# Altium footprint library camara_Trap.PcbLib: 29 footprints (part 1 of 2)
Each footprint in its own frame and in the unit in brackets; x right, y up, seen from the top. Pads: shape width x height; smd on the part's side, far side on the other; paste and mask are expansions set on the pad; w line width, h text height; cw(c..) or ccw(c..) is an arc to the next point about the centre after c.
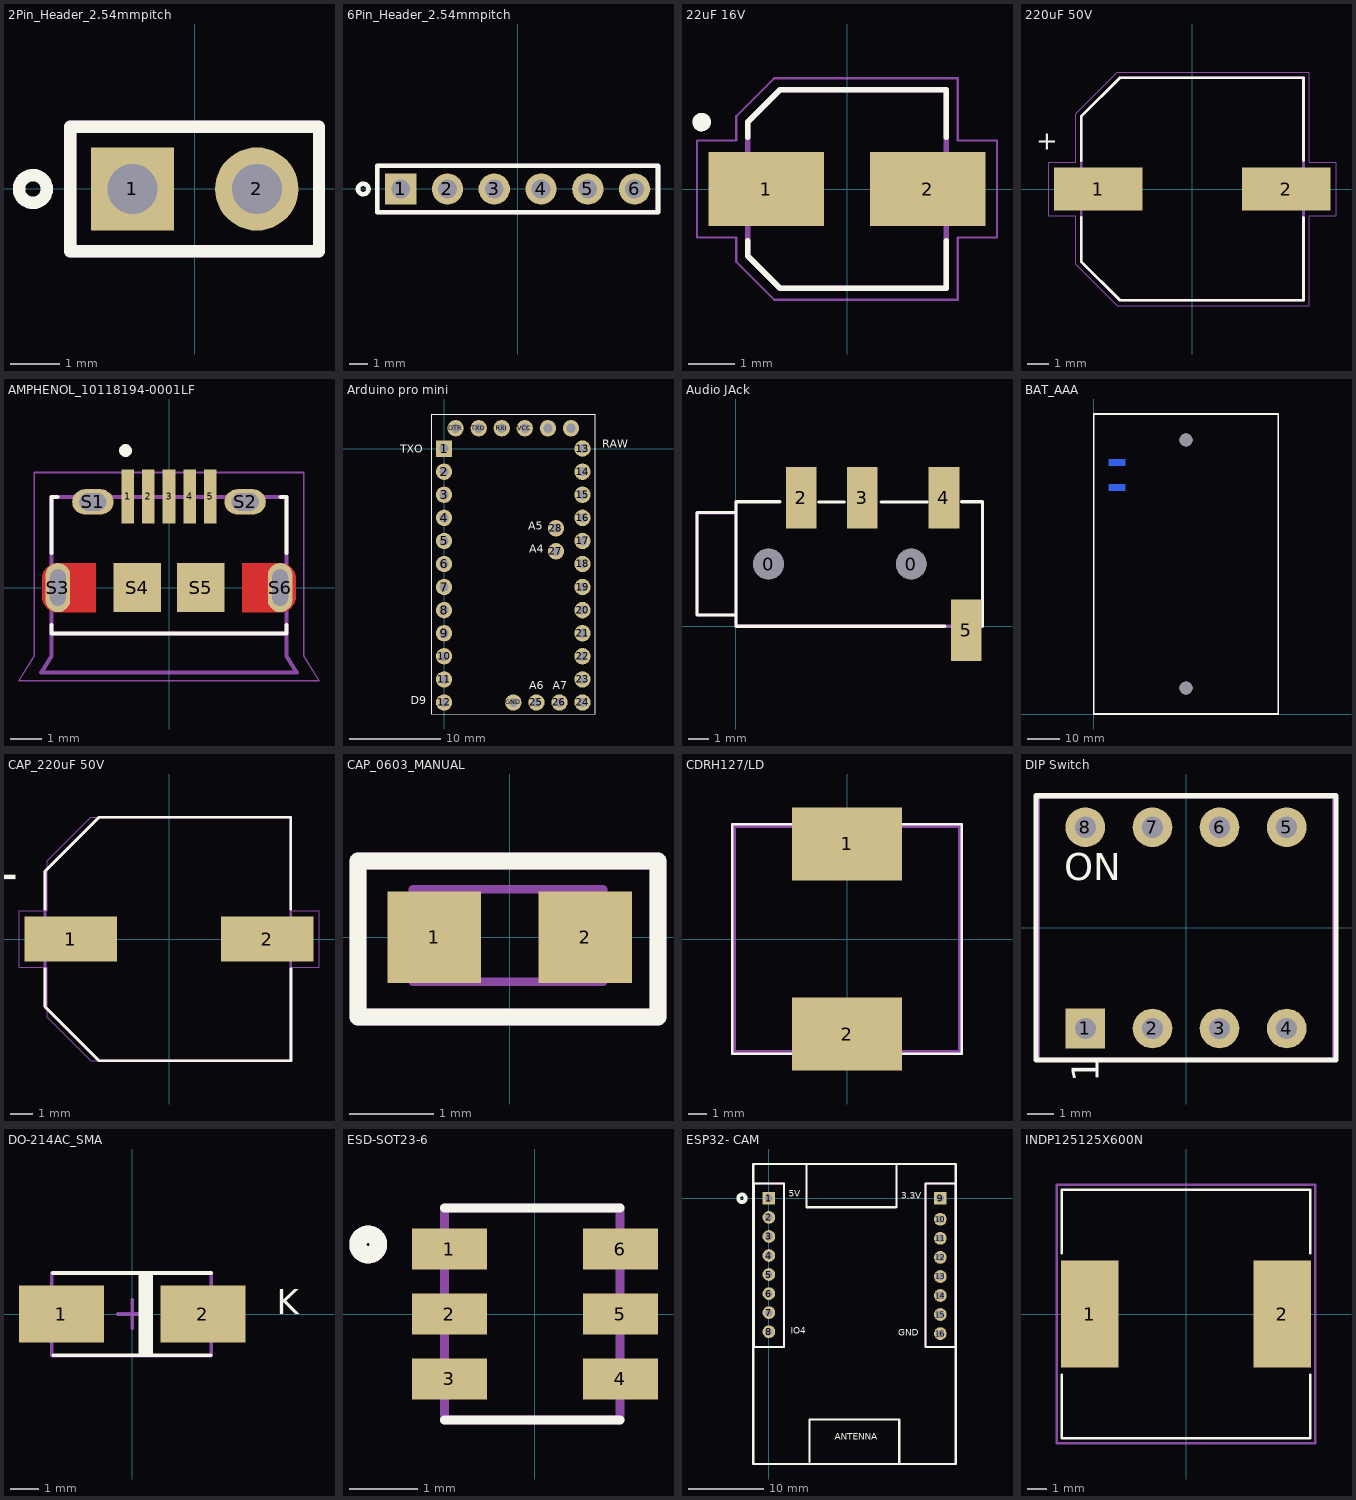
[diagram p0: the footprints below, top view; thin cyan lines are the x and y axes]

## 2Pin_Header_2.54mmpitch [mm]
pads (2):
  rect 1.7x1.7 hole 1.02: 1(-1.27,0)
  round 1.7 hole 1.02: 2(1.27,0)
Top Overlay:
  circle w0.254: c-3.302,0 r0.284
  lines w0.254: -2.54,-1.27 2.54,-1.27 2.54,1.27 -2.54,1.27 -2.54,-1.27
Mechanical 13:
  lines w0.254: -2.54,-1.27 2.54,-1.27 2.54,1.27 -2.54,1.27 -2.54,-1.27
Mechanical 15:
  lines w0.254: -2.54,-1.27 2.54,-1.27 2.54,1.27 -2.54,1.27 -2.54,-1.27
3D body "TSW-101-14-L-D.stp": height 10.17, standoff -3.29, extent -2.54,-1.27 2.54,1.27

## 6Pin_Header_2.54mmpitch [mm]
pads (6):
  rect 1.7x1.7 hole 1.02: 1(-6.35,0)
  round 1.7 hole 1.02: 2(-3.81,0) 3(-1.27,0) 4(1.27,0) 5(3.81,0) 6(6.35,0)
Top Overlay:
  circle w0.254: c-8.382,0 r0.284
  lines w0.254: -7.62,-1.27 7.62,-1.27 7.62,1.27 -7.62,1.27 -7.62,-1.27
Mechanical 13:
  lines w0.254: -7.62,-1.27 7.62,-1.27 7.62,1.27 -7.62,1.27 -7.62,-1.27
Mechanical 15:
  lines w0.254: -7.62,-1.27 7.62,-1.27 7.62,1.27 -7.62,1.27 -7.62,-1.27

## 22uF 16V [mm]
height 5.4
pads (2):
  rect 2.5x1.6 smd: 1(-1.75,0) 2(1.75,0)
Top Overlay:
  circle w0.2: c-3.15,1.45 r0.1
  lines w0.127: -2.15,-1.12 -2.15,-1.45 -1.45,-2.15 2.15,-2.15 2.15,-1.12 ; -2.15,1.12 -2.15,1.45 -1.45,2.15 2.15,2.15 2.15,1.12
Mechanical 13:
  circle w0.2: c-3.15,1.45 r0.1
  lines w0.127: -2.15,-1.45 -2.15,1.45 -1.45,2.15 2.15,2.15 2.15,-2.15 -1.45,-2.15 -2.15,-1.45
Mechanical 15:
  lines w0.05: -3.25,-1.05 -2.4,-1.05 -2.4,-1.575 -1.575,-2.4 2.4,-2.4 2.4,-1.05 3.25,-1.05 3.25,1.05 2.4,1.05 2.4,2.4 -1.575,2.4 -2.4,1.575 -2.4,1.05 -3.25,1.05 -3.25,-1.05
3D body "step_temp.STEP": height 5.4, standoff 0, extent -2.5,-2.15 2.5,2.15

## 220uF 50V [mm]
pads (2):
  rect 4.1x2 smd: 1(-4.35,0) 2(4.35,0)
Top Overlay:
  lines w0.127: -5.15,-1.32 -5.15,-3.35 -3.35,-5.15 5.15,-5.15 5.15,-1.32 ; -5.15,1.32 -5.15,3.35 -3.35,5.15 5.15,5.15 5.15,1.32
  text "+" at -7.239,1.524 h1.5
Mechanical 13:
  lines w0.127: -5.15,-3.35 -3.35,-5.15 5.15,-5.15 5.15,5.15 -3.35,5.15 -5.15,3.35 -5.15,-3.35
Mechanical 15:
  lines w0.05: -6.65,-1.25 -6.65,1.25 -5.4,1.25 -5.4,3.475 -3.475,5.4 5.4,5.4 5.4,1.25 6.65,1.25 6.65,-1.25 5.4,-1.25 5.4,-5.4 -3.475,-5.4 -5.4,-3.475 -5.4,-1.25 -6.65,-1.25
3D body "step_temp.STEP": height 10.3, standoff 0.1, extent -5.85,-5.15 5.85,5.15

## AMPHENOL_10118194-0001LF [mm]
pads (11):
  rect 0.4x1.7 smd: 1(-1.3,2.875) 2(-0.65,2.875) 3(0,2.875) 4(0.65,2.875) 5(1.3,2.875)
  oval 1.3x0.8 hole 0.55 slot 0.85 at 0 deg: S1(-2.4,2.7) S2(2.4,2.7)
  oval 0.775x1.55 hole 0.5 slot 1.15 at 90 deg: S3(-3.5,0) S6(3.5,0)
  rect 1.5x1.55 smd: S4(-1,0) S5(1,0)
Top Layer:
  region: 191 vertices and 0 holes, not listed, extent 2.3,-0.78 4,0.775
  region: 191 vertices and 0 holes, not listed, extent -4,-0.775 -2.3,0.78
Top Overlay:
  circle w0.2: c-1.37,4.318 r0.1
  lines w0.127: -3.7,-1.18 -3.7,-1.45 3.7,-1.45 3.7,-1.18 ; -3.7,1.095 -3.7,2.85 -3.52,2.85 ; 3.52,2.85 3.7,2.85 3.7,1.095
Top Paste:
  drawing of 6 lines, arcs and shapes, not listed
Top Solder:
  region: 3.626,0.874 3.652,0.872 3.678,0.869 3.704,0.864 3.729,0.858 3.755,0.851 3.779,0.842 3.803,0.832 3.827,0.821 3.85,0.808 3.872,0.794 3.894,0.78 3.915,0.764 3.935,0.747 3.954,0.729 3.972,0.71 3.989,0.69 4.005,0.669 4.019,0.647 4.033,0.625 4.046,0.602 4.057,0.578 4.067,0.554 4.076,0.53 4.083,0.504 4.089,0.479 4.094,0.453 4.097,0.427 4.099,0.401 4.1,0.375 4.1,-0.375 4.099,-0.401 4.097,-0.427 4.094,-0.453 4.089,-0.479 4.083,-0.504 4.076,-0.53 4.067,-0.554 4.057,-0.578 4.046,-0.602 4.033,-0.625 4.019,-0.647 4.005,-0.669 3.989,-0.69 3.972,-0.71 3.954,-0.729 3.935,-0.747 3.915,-0.764 3.894,-0.78 3.872,-0.794 3.85,-0.808 3.827,-0.821 3.803,-0.832 3.779,-0.842 3.755,-0.851 3.729,-0.858 3.704,-0.864 3.678,-0.869 3.652,-0.872 3.626,-0.874 3.6,-0.875 2.2,-0.875 2.2,0.875 3.6,0.875
  region: -2.2,-0.875 -3.6,-0.875 -3.626,-0.874 -3.652,-0.872 -3.678,-0.869 -3.704,-0.864 -3.729,-0.858 -3.755,-0.851 -3.779,-0.842 -3.803,-0.832 -3.827,-0.821 -3.85,-0.808 -3.872,-0.794 -3.894,-0.78 -3.915,-0.764 -3.935,-0.747 -3.954,-0.729 -3.972,-0.71 -3.989,-0.69 -4.005,-0.669 -4.019,-0.647 -4.033,-0.625 -4.046,-0.602 -4.057,-0.578 -4.067,-0.554 -4.076,-0.53 -4.083,-0.504 -4.089,-0.479 -4.094,-0.453 -4.097,-0.427 -4.099,-0.401 -4.1,-0.375 -4.1,0.375 -4.099,0.401 -4.097,0.427 -4.094,0.453 -4.089,0.479 -4.083,0.504 -4.076,0.53 -4.067,0.554 -4.057,0.578 -4.046,0.602 -4.033,0.625 -4.019,0.647 -4.005,0.669 -3.989,0.69 -3.972,0.71 -3.954,0.729 -3.935,0.747 -3.915,0.764 -3.894,0.78 -3.872,0.794 -3.85,0.808 -3.827,0.821 -3.803,0.832 -3.779,0.842 -3.755,0.851 -3.729,0.858 -3.704,0.864 -3.678,0.869 -3.652,0.872 -3.626,0.874 -3.6,0.875 -2.2,0.875
Mechanical 13:
  circle w0.2: c-1.37,4.318 r0.1
  lines w0.127: -3.7,-1.45 -3.7,-2.15 -4.025,-2.68 4.025,-2.68 3.7,-2.15 3.7,-1.45 ; -3.7,-1.45 -3.7,2.85 3.7,2.85 3.7,-1.45 ; -3.7,-1.45 3.7,-1.45
  text "PCB END" at -1.95,-2.1 h0.5
Mechanical 15:
  lines w0.05: -4.725,-2.93 -4.25,-2.15 -4.25,3.625 4.25,3.625 4.25,-2.15 4.725,-2.93 -4.725,-2.93
3D body "step_temp.STEP": height 2.67, standoff -0.6, extent -4.025,-2.68 4.025,2.85

## Arduino pro mini [mm]
pads (35):
  rect 1.8x1.8 hole 1 mask+0.102: 1(0,0)
  round 1.8 hole 1 mask+0.102: 2(0,-2.54) 3(0,-5.08) 4(0,-7.62) 5(0,-10.16) 6(0,-12.7) 7(0,-15.24) 8(0,-17.78) 9(0,-20.32) 10(0,-22.86) 11(0,-25.4) 12(0,-27.94) 13(15.24,0) 14(15.24,-2.54) 15(15.24,-5.08) 16(15.24,-7.62) 17(15.24,-10.16) 18(15.24,-12.7) 19(15.24,-15.24) 20(15.24,-17.78) 21(15.24,-20.32) 22(15.24,-22.86) 23(15.24,-25.4) 24(15.24,-27.94) 25(10.16,-27.94) 26(12.7,-27.94) 27(12.319,-11.303) 28(12.319,-8.763) DTR(1.27,2.24) GND(7.62,-27.94) GND1(11.43,2.24) GND2(13.97,2.24) RXI(6.35,2.24) TXO(3.81,2.24) VCC(8.89,2.24)
Top Overlay:
  lines w0.127: -1.38,-29.21 -1.38,3.81 16.62,3.81 16.62,-29.21 -1.38,-29.21
  text "A5" at 9.271,-9.271 h1.5
  text "A4" at 9.398,-11.811 h1.5
  text "RAW" at 17.399,-0.254 h1.5
  text "A7" at 11.938,-26.797 h1.5
  text "A6" at 9.398,-26.797 h1.5
  text "D9" at -3.683,-28.448 h1.5
  text "TXO" at -4.826,-0.762 h1.5
3D body "User Library-User Library-ARDUINO_MINI_V2 v11.STEP": height 13.6, standoff -5, extent -1.807,-29.845 16.793,4.155

## Audio JAck [mm]
pads (6):
  round 1.5 hole 1.5 unplated: 0(1.6,3.05) 0(8.6,3.05)
  rect 1.5x3 smd: 2(3.2,6.3) 3(6.2,6.3) 4(10.2,6.3) 5(11.3,-0.2)
Top Overlay:
  lines w0.15: -0.086,0.558 -1.905,0.558 -1.905,5.571 -0.086,5.571 ; 2.155,6.1 0,6.1 0,0 10.251,0 ; 4.064,6.096 5.334,6.096 ; 7.112,6.096 9.398,6.096 ; 11.053,6.1 12.1,6.1 12.1,0
Mechanical 13:
  lines w0.15: -0.086,5.56 -1.905,5.56 -1.905,0.558 0,0.558 ; 0,6.1 0,0 12.1,0 12.1,6.1
3D body "step_temp.STEP": height 5.4, standoff -0.4, extent -1.912,-1.279 13.088,7.121

## BAT_AAA [mm]
pads (4):
  rect 5x2 smd far side mask+0.102: 1(7.227,77.528) 2(7.227,69.828)
  round 4 hole 4: ""(28.5,8)
  round 4 hole 4 unplated: ""(28.5,84.5)
Top Overlay:
  lines w0.5: 50.5,0 0,0 ; 0,0 57,0 57,92.5 0,92.5 0,0
Bottom Overlay:
  text "+" at 12.446,78.613 h4
  text "-" at 11.938,70.612 h4

## CAP_220uF 50V [mm]
pads (2):
  rect 4.1x2 smd: 1(-4.35,0) 2(4.35,0)
Top Overlay:
  lines w0.127: -5.5,-1.32 -5.5,-3 -3.1,-5.4 5.406,-5.4 5.406,-1.32 ; -5.5,1.32 -5.5,3 -3.1,5.4 5.4,5.4 5.4,1.32
  text "+" at -6.222,1.75 h3
Mechanical 13:
  lines w0.127: -5.5,-3 -5.5,3 -3.1,5.4 5.4,5.4 5.4,-5.4 -3.1,-5.4 -5.5,-3
Mechanical 15:
  lines w0.05: -6.65,-1.25 -5.4,-1.25 -5.4,-3.475 -3.475,-5.4 5.4,-5.4 5.4,-1.25 6.65,-1.25 6.65,1.25 5.4,1.25 5.4,5.4 -3.475,5.4 -5.4,3.475 -5.4,1.25 -6.65,1.25 -6.65,-1.25
3D body "step_temp.STEP": height 10.3, standoff 0.1, extent -5.85,-5.15 5.85,5.15

## CAP_0603_MANUAL [mil]
height 35.43
pads (2):
  rect 44x43 smd: 1(-35.43,0) 2(35.43,0)
Top Overlay:
  lines w8: -71.34,-37.44 69.63,-37.44 69.63,35.99 -71.34,35.99 -71.34,-37.44
Mechanical 13:
  lines w4: -45.71,-20.73 43.88,-20.73 43.88,22.6 -45.71,22.6 -45.71,-20.73
Mechanical 15:
  lines w8: -71.34,-37.44 69.63,-37.44 69.63,35.99 -71.34,35.99 -71.34,-37.44
3D body "User Library-CerCaps_0603.step": height 31.99, standoff -0.49, extent -36.61,-16.23 36.62,16.25

## CDRH127/LD [mm]
pads (2):
  rect 6x4 smd: 1(0,5.203) 2(0,-5.203)
Top Overlay:
  lines w0.152: -3.048,-6.274 -6.274,-6.274 -6.274,6.274 -3.048,6.274 ; 3.048,-6.274 6.274,-6.274 6.274,6.274 3.048,6.274
Mechanical 13:
  lines w0: 0,5.994 cw(c0,6.071) 0,6.147 cw(c0,6.071) 0,5.994
  lines w0.152: -6.147,-6.147 -6.147,6.147 0,6.147 6.147,6.147 6.147,-6.147 -6.147,-6.147
3D body "LDNP-470MC--3DModel-STEP-56544.STEP": height 8, standoff 0, extent -6,-6 6,6

## DIP Switch [mm] "2.54 mm compact THT with raised actuator, 4p"
height 6.3
pads (8):
  rect 1.5x1.5 hole 0.8: 1(-3.81,-3.81)
  round 1.5 hole 0.8: 2(-1.27,-3.81) 3(1.27,-3.81) 4(3.81,-3.81) 5(3.81,3.81) 6(1.27,3.81) 7(-1.27,3.81) 8(-3.81,3.81)
Top Overlay:
  lines w0.2: -5.68,-5 -5.68,5 5.68,5 5.68,-5 -5.68,-5
  text "1" at -3.302,-5.842 h1.02
  text "ON" at -4.61,1.8 h1.02
Top Component Outline:
  lines w0.1: -5.58,-4.95 5.58,-4.95 5.58,4.95 -5.58,4.95 -5.58,-4.95
3D body "418117270904.stp": height 6.9, standoff -3.65, extent -5.58,-4.95 5.58,4.95

## DO-214AC_SMA [mm]
height 2.5
pads (2):
  rect 3x2 smd: 1(-2.5,0) 2(2.5,0)
Top Overlay:
  rectangle: 0.219,-1.473 0.737,1.448
  lines w0.127: -2.798,1.448 2.794,1.448 ; -2.795,-1.46 2.771,-1.46
  text "K" at 5.105,-0.305 h1.5
Mechanical 13:
  lines w0.127: -2.845,-1.473 2.794,-1.473 2.794,1.448 -2.845,1.448 -2.845,-1.473
  text "K" at 5.105,-0.305 h1.5
Mechanical 15:
  lines w0.127: -0.5,0 0.5,0 ; 0,-0.5 0,0.5
3D body "SMA.stp": height 2.55, standoff 0.2, extent -2.795,-1.46 2.795,1.46

## ESD-SOT23-6 [mm]
pads (6):
  rect 1.1x0.6 smd: 1(-1.25,0.95) 2(-1.25,0) 3(-1.25,-0.95) 4(1.25,-0.95) 5(1.25,0) 6(1.25,0.95)
Top Overlay:
  circle w0.254: c-2.436,1.016 r0.15
  lines w0.127: -1.321,-1.549 1.245,-1.549 ; -1.321,1.549 1.245,1.549
Mechanical 13:
  circle w0.254: c-2.436,1.016 r0.15
  lines w0.127: -1.321,-1.549 -1.321,1.549 1.245,1.549 1.245,-1.549 -1.321,-1.549
3D body "SN74LVC2G17DBVR.STEP": height 1.45, standoff 0, extent -1.4,-1.45 1.4,1.45

## ESP32- CAM [mm]
pads (16):
  rect 1.7x1.7 hole 1.02: 1(0,0) 9(22.86,0)
  round 1.7 hole 1.02: 2(0,-2.54) 3(0,-5.08) 4(0,-7.62) 5(0,-10.16) 6(0,-12.7) 7(0,-15.24) 8(0,-17.78) 10(22.86,-2.794) 11(22.86,-5.334) 12(22.86,-7.874) 13(22.86,-10.414) 14(22.86,-12.954) 15(22.86,-15.494) 16(22.86,-18.034)
Top Overlay:
  circle w0.5: c-3.594,0.008 r0.5
  lines w0.254: -2,-19.812 -2,2 2.032,2 2.032,-19.812 -2,-19.812 ; 20.86,-19.812 20.86,2 24.892,2 24.892,-19.812 20.86,-19.812
  lines w0.3: 5.023,4.58 5.023,-1.2 16.961,-1.2 17.018,-1.143 17.018,4.454 ; 5.404,-35.142 5.404,-29.545 ; 5.461,-29.489 17.399,-29.489 17.399,-35.268 ; -2.07,-35.42 -2.07,4.58 24.93,4.58 24.93,-35.42 -2.07,-35.42
  text "IO4" at 2.921,-18.415 h1.5
  text "5V" at 2.667,-0.127 h1.5
  text "ANTENNA" at 8.763,-32.512 h1.5
  text "GND" at 17.272,-18.669 h1.5
  text "3.3V" at 17.653,-0.381 h1.5
Mechanical 13:
  lines w0.254: -2,-19.812 -2,2 2.032,2 2.032,-19.812 -2,-19.812 ; 20.86,-19.812 20.86,2 24.892,2 24.892,-19.812 20.86,-19.812
Mechanical 15:
  lines w0.254: -2,-19.812 -2,2 2.032,2 2.032,-19.812 -2,-19.812 ; 20.86,-19.812 20.86,2 24.892,2 24.892,-19.812 20.86,-19.812
3D body "ESP3-CAM v5 - black pcb.step": height 21.07, standoff 2.99, extent -2.108,-35.363 24.892,5.137
3D body "8Fx1-254mm--3DModel-STEP-56544.STEP": height 8.65, standoff -3.4, extent 21.572,-19.423 24.072,1.147
3D body "8Fx1-254mm--3DModel-STEP-56544.STEP": height 8.65, standoff -3.4, extent -1.141,-19.167 1.359,1.403

## INDP125125X600N [mm]
pads (2):
  rect 2.9x5.4 smd: 1(-4.85,0) 2(4.85,0)
Top Overlay:
  lines w0.127: -6.25,-3.05 -6.25,-6.25 6.25,-6.25 6.25,-3.05 ; -6.25,3.05 -6.25,6.25 6.25,6.25 6.25,3.05
Mechanical 15:
  lines w0.127: -6.5,-6.5 6.5,-6.5 6.5,6.5 -6.5,6.5 -6.5,-6.5
3D body "srr1260-330m.stp": height 6, standoff 0, extent -6.25,-6.45 6.25,6.05